# Altium footprint library Footprints_SOC.PcbLib: 201 footprints (part 2 of 13)
Each footprint in its own frame and in the unit in brackets; x right, y up, seen from the top. Pads: shape width x height; smd on the part's side, far side on the other; paste and mask are expansions set on the pad; w line width, h text height; cw(c..) or ccw(c..) is an arc to the next point about the centre after c.
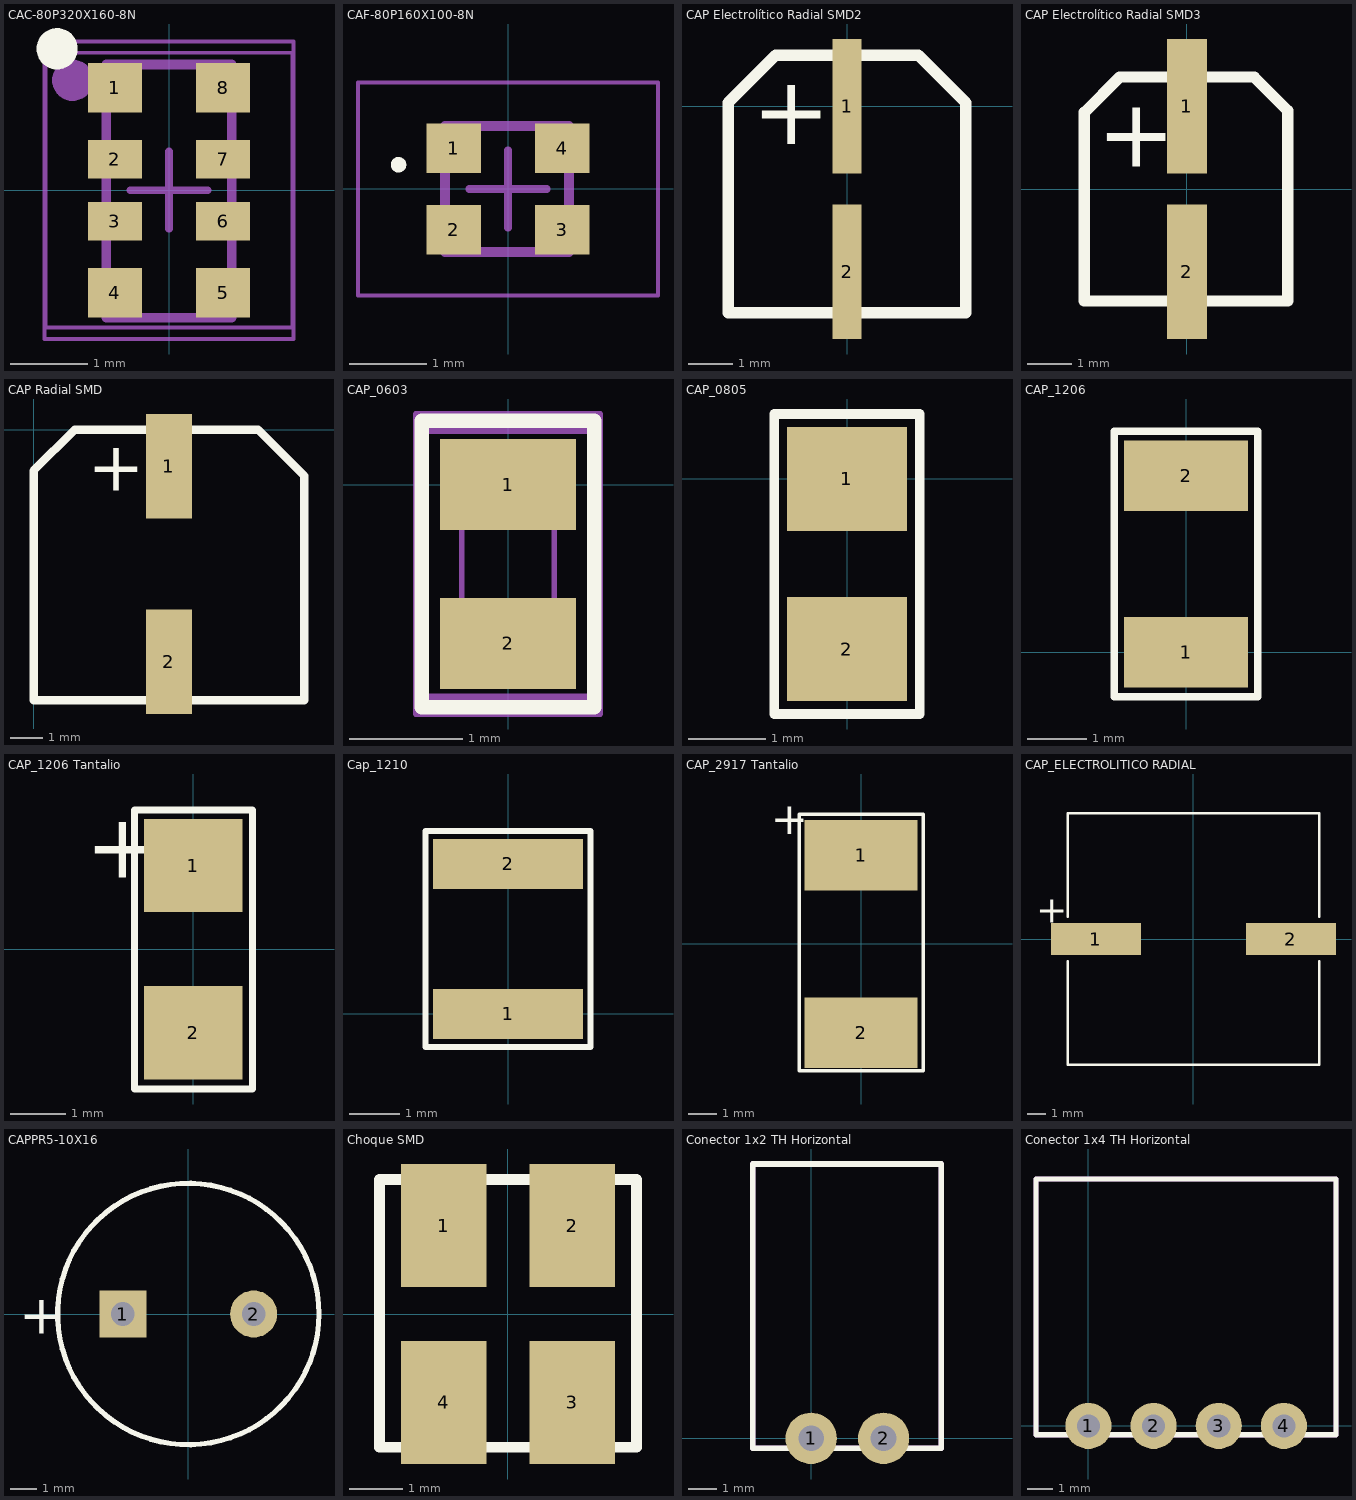
[diagram p1: the footprints below, top view; thin cyan lines are the x and y axes]

## CAC-80P320X160-8N [mm] "Chip Array, ConvexS, 8-Leads, Pitch 0,80mm,  Body 3,20x1,60mm,  IPC Medium Density"
height 1
pads (8):
  rect 0.7x0.64 smd: 1(-0.7,1.325) 4(-0.7,-1.325) 5(0.7,-1.325) 8(0.7,1.325)
  rect 0.7x0.5 smd: 2(-0.7,0.4) 3(-0.7,-0.4) 6(0.7,-0.4) 7(0.7,0.4)
Top Overlay:
  circle w0.279: c-1.448,1.829 r0.127
Top 3D Body:
  lines w0.127: -0.813,-1.651 -0.813,1.626 0.813,1.626 0.813,-1.651 -0.813,-1.651
Top Assembly:
  circle w0.279: c-1.245,1.422 r0.127
  lines w0.051: -1.6,-1.778 -1.6,1.778 1.6,1.778 1.6,-1.778 -1.6,-1.778
  text ".Designator" at 1.575,0.296 h1.02
Mechanical 15:
  lines w0.05: -1.61,-1.925 1.61,-1.925 1.61,1.925 -1.61,1.925 -1.61,-1.925
  lines w0.1: -0.5,0 0.5,0 ; 0,-0.5 0,0.5
3D body "User Library-RESCAXS80P160X320X60-8N.STEP": height 0.45, standoff -0.05, extent -0.8,-1.65 0.8,1.65

## CAF-80P160X100-8N [mm]
height 0.55
pads (4):
  rect 0.7x0.64 smd: 1(-0.7,0.525) 2(-0.7,-0.525) 3(0.7,-0.525) 4(0.7,0.525)
Top Overlay:
  circle w0.1: c-1.412,0.313 r0.05
Top 3D Body:
  lines w0.127: -0.813,-0.813 0.787,-0.813 0.787,0.813 -0.813,0.813 -0.813,-0.813
Mechanical 15:
  lines w0.05: -1.935,-1.375 1.935,-1.375 1.935,1.375 -1.935,1.375 -1.935,-1.375
  lines w0.1: -0.5,0 0.5,0 ; 0,-0.5 0,0.5
3D body "User Library-742C043.STEP": height 0.53, standoff -0.03, extent -0.8,-0.8 0.8,0.8

## CAP Electrolítico Radial SMD2 [mm] "Mediano"
pads (2):
  rect 0.65x3 smd: 1(0,0) 2(0,-3.7)
Top Overlay:
  lines w0.254: -2.65,-4.61 2.65,-4.61 2.65,0.08 1.59,1.14 -1.59,1.14 -2.65,0.08 -2.65,-4.61
  text "+" at -2.12,-0.85 h1.52
3D body "capacitor radial smd.step": height 5.41, standoff -0.01, extent -2.66,-4.79 2.64,1.11

## CAP Electrolítico Radial SMD3 [mm] "4.3x4.3x5.8mm"
pads (2):
  rect 0.9x3 smd: 1(0,1.85) 2(0,-1.85)
Top Overlay:
  lines w0.254: -2.29,-2.5 -2.29,1.71 -1.5,2.5 1.5,2.5 2.248,1.752 2.248,-2.5 -2.29,-2.5
  text "+" at -2,0.5 h1.52
3D body "cap electrolitico 4.3x4.3mm.step": height 6.35, standoff 0, extent -2.248,-2.502 2.248,2.502

## CAP Radial SMD [mm] "Grande"
pads (2):
  rect 1.4x3.2 smd: 1(4.15,-1.12) 2(4.15,-7.12)
Top Overlay:
  lines w0.254: 0,-8.3 0,-1.26 1.26,0 6.88,0 8.3,-1.42 8.3,-8.3 0,-8.3
  text "+" at 1.66,-1.87 h1.52

## CAP_0603 [mm] "CAP CER 0603"
pads (2):
  rect 1.2x0.8 smd: 1(0,0) 2(0,-1.4)
Top Overlay:
  lines w0.127: -0.76,-1.96 0.76,-1.96 0.76,0.56 -0.76,0.56 -0.76,-1.96
Top 3D Body:
  lines w0.051: -0.406,-1.462 -0.406,0.164 0.406,0.164 0.406,-1.462 -0.406,-1.462
Top Assembly:
  lines w0.127: -0.762,-1.905 0.762,-1.905 0.762,0.508 -0.762,0.508 -0.762,-1.905
  text ".Designator" at 0.195,-1.854 h0.64
Mechanical 15:
  lines w0.051: -0.813,-2.021 0.813,-2.021 0.813,0.621 -0.813,0.621 -0.813,-2.021
3D body "Condensador 0603.step": height 0.4, standoff -0.4, extent -0.4,-1.462 0.4,0.138

## CAP_0805 [mm] "CAP CER 0805"
pads (2):
  rect 1.55x1.35 smd: 1(0,0) 2(0,-2.2)
Top Overlay:
  lines w0.127: -0.94,-3.04 -0.94,0.84 0.94,0.84 0.94,-3.04 -0.94,-3.04
3D body "Condensador 0805.step": height 0.6, standoff 0, extent -0.62,-2.1 0.63,-0.1

## CAP_1206 [mm]
pads (2):
  rect 2.1x1.2 smd: 1(0,0) 2(0,3)
Top Overlay:
  lines w0.127: -1.22,-0.76 -1.22,3.76 1.22,3.76 1.22,-0.76 -1.22,-0.76
3D body "Condensador 1206.step": height 1.6, standoff 0, extent -0.8,-0.01 0.8,3.19

## CAP_1206 Tantalio [mm] "Case A"
pads (2):
  rect 1.8x1.7 smd: 1(0,1.525) 2(0,-1.525)
Top Overlay:
  lines w0.127: -1.07,-2.55 1.08,-2.55 1.08,2.54 -1.07,2.54 -1.07,-2.55
  text "+" at -1.96,0.92 h2
3D body "TR3 A-CASE.stp": height 1.84, standoff 0.01, extent -0.949,-1.525 0.949,1.879

## Cap_1210 [mm] "1210 SMD"
pads (2):
  rect 3x1 smd: 1(0,0) 2(0,3)
Top Overlay:
  lines w0.127: -1.651,-0.66 -1.651,3.66 1.651,3.66 1.651,-0.66 -1.651,-0.66
3D body "Condensador 1210.STEP": height 1.5, standoff 0, extent -1.3,-0.2 1.3,3.2

## CAP_2917 Tantalio [mm] "Case D"
pads (2):
  rect 4x2.5 smd: 1(0,3.15) 2(0,-3.15)
Top Overlay:
  lines w0.127: -2.2,-4.5 -2.2,4.6 2.2,4.6 2.2,-4.5 -2.2,-4.5
  text "+" at -3.2,3.5 h2
3D body "TR3 D-CASE.stp": height 2.98, standoff 0.06, extent -2.216,-3.594 2.2,3.594

## CAP_ELECTROLITICO RADIAL [mm] "13.5x13.5mm P/N: EEE-FK2A680AQ"
pads (2):
  rect 5x1.794 smd paste+0 mask+0: 1(-5.406,0) 2(5.406,0)
Top Overlay:
  lines w0.152: -6.972,-1.23 -6.972,-6.972 6.972,-6.972 6.972,-1.23 ; -6.972,1.23 -6.972,6.972 6.972,6.972 6.972,1.23
  text "+" at -8.73,0.91 h1.52
3D body "CAP_EEFK_H13-L.step": height 14.05, standoff 0, extent -7.506,-6.845 7.506,6.845

## CAPPR5-10X16 [mm]
pads (2):
  rect 1.8x1.8 hole 0.9: 1(-2.5,0)
  round 1.8 hole 0.9: 2(2.5,0)
Top Overlay:
  circle w0.2: c0,0 r5
  text "+" at -6.475,-0.75 h1.5

## Choque SMD [mm] "SRF0504-102Y"
pads (4):
  rect 1.6x2.3 smd: 1(-1.2,1.65) 2(1.2,1.65) 3(1.2,-1.65) 4(-1.2,-1.65)
Top Overlay:
  lines w0.2: -2.4,-2.49 -2.4,2.51 2.4,2.51 2.4,-2.49 -2.4,-2.49

## Conector 1x2 TH Horizontal [mm] "Pitch 2.54mm P/N: IPL1-102-01-S-S-RA-K"
pads (2):
  round 1.8 hole 0.9: 1(0,0) 2(2.54,0)
Top Overlay:
  lines w0.2: -2.044,-0.345 4.56,-0.345 4.56,9.625 -2.044,9.625 -2.044,-0.345
Top Assembly:
  lines w0.2: -2.044,-0.345 -2.044,9.625 4.56,9.625 4.56,-0.345 -2.044,-0.345
  text ".Designator" at 1.899,1.143 h2
3D body "Conector 1x2 TH Horizontal - IPL1-102-01-S-S-RA-K.stp": height 7.06, standoff -1.71, extent -2.044,-0.345 4.56,9.625

## Conector 1x4 TH Horizontal [mm] "Pitch 2.54mm P/N: IPL1-104-01-L-S-RA-K"
pads (4):
  round 1.8 hole 0.9 unplated: 1(0,0) 2(2.54,0) 3(5.08,0) 4(7.62,0)
Top Overlay:
  lines w0.2: -2.044,-0.345 9.652,-0.345 9.652,9.625 -2.044,9.625 -2.044,-0.345
Top Assembly:
  lines w0.2: -2.044,-0.345 -2.044,9.625 9.652,9.625 9.652,-0.345 -2.044,-0.345
  text ".Designator" at 4.337,0.762 h2
3D body "Conector 1x4 TH Horizontal - IPL1-104-01-L-S-RA-K.stp": height 7.06, standoff -1.71, extent -2.032,-0.301 9.652,9.668